# Altium footprint library Intelliclone.PcbLib: 372 footprints (part 10 of 24)
Each footprint in its own frame and in the unit in brackets; x right, y up, seen from the top. Pads: shape width x height; smd on the part's side, far side on the other; paste and mask are expansions set on the pad; w line width, h text height; cw(c..) or ccw(c..) is an arc to the next point about the centre after c.
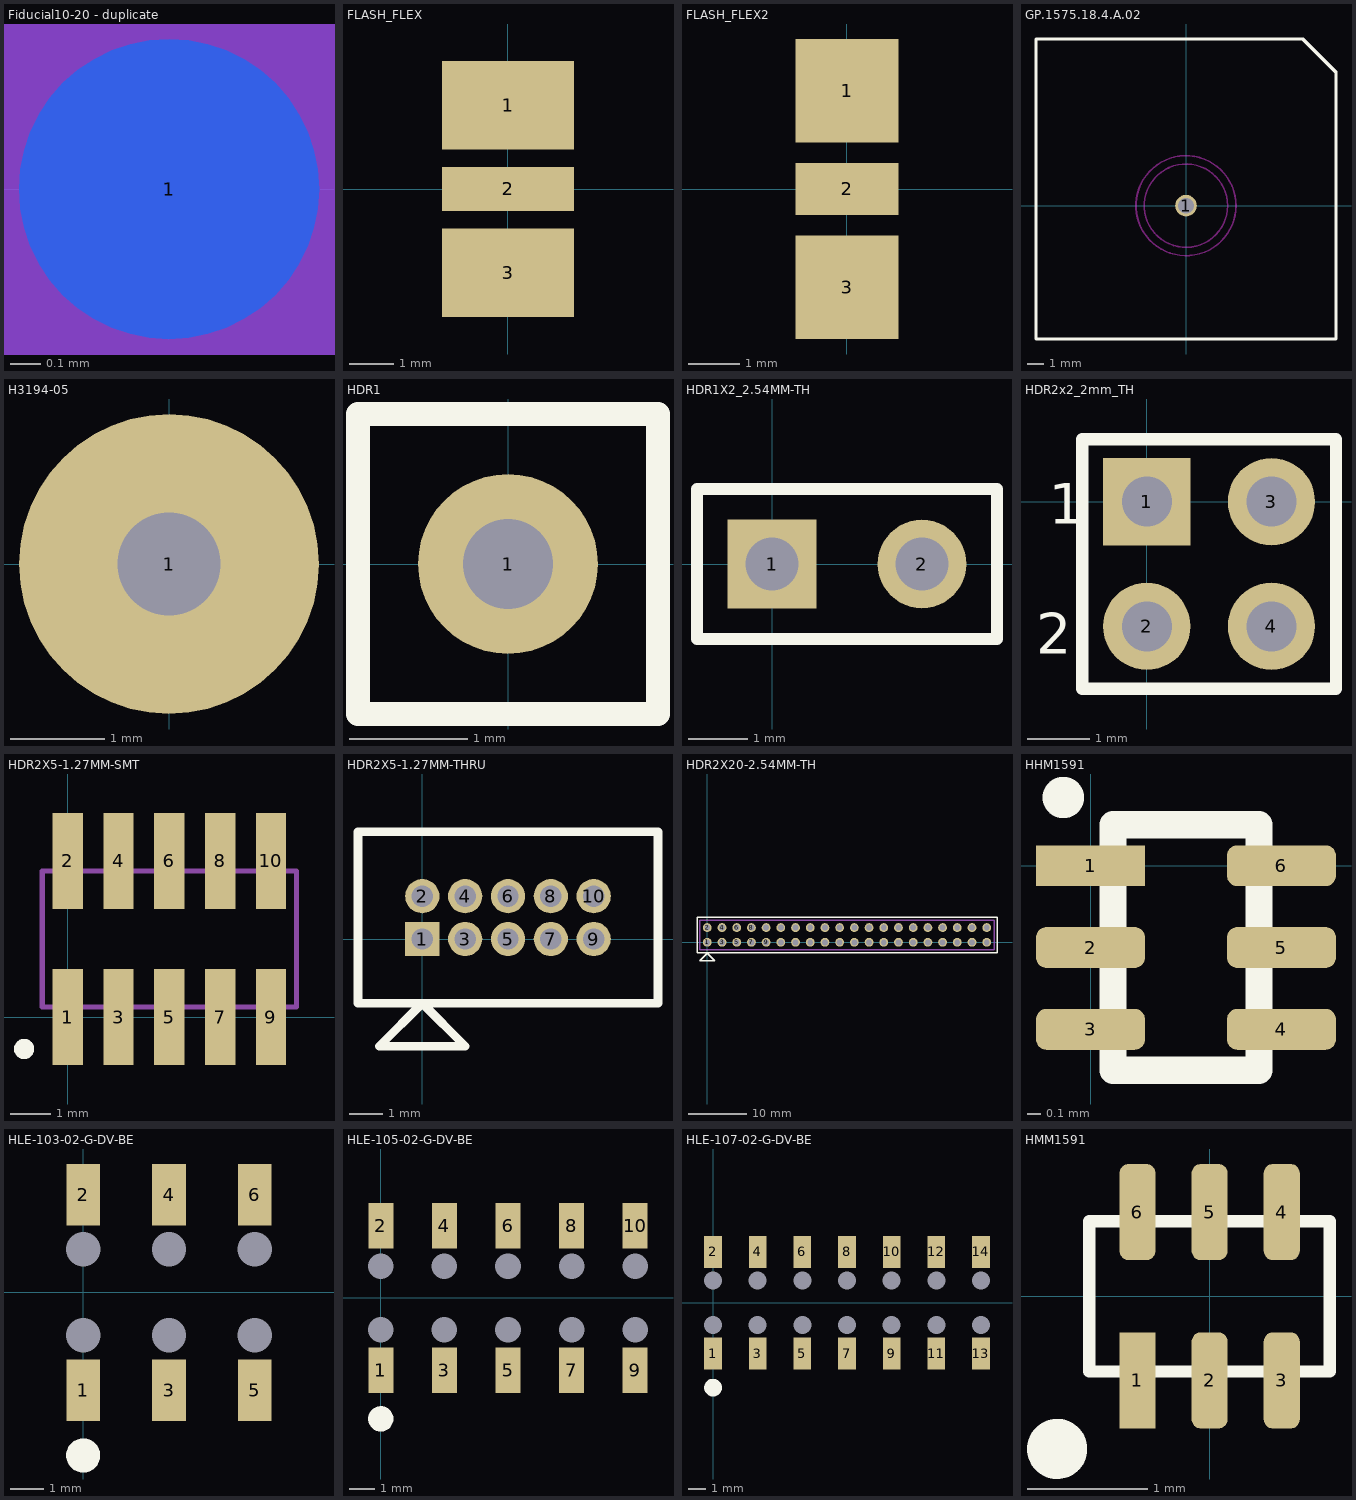
[diagram p9: the footprints below, top view; thin cyan lines are the x and y axes]

## Fiducial10-20 - duplicate [mm]
height 0.4
pads (1):
  round 1 smd far side mask+0.5: 1(0,0)
Bottom Layer keep-out:
  circle w1.178: c0,0 r0.5

## FLASH_FLEX [mm] "Hot Bar Connect for Flash LED"
pads (3):
  rect 3x2 smd paste-5: 1(0,1.9) 3(0,-1.9)
  rect 3x1 smd paste-5: 2(0,0)

## FLASH_FLEX2 [mm] "Hot Bar Connect for Flash LED"
pads (3):
  rect 2x2 smd paste-5: 1(0,1.9) 3(0,-1.9)
  rect 2x1 smd paste-5: 2(0,0)

## GP.1575.18.4.A.02 [mm] "ANTENNA PATCH GPS PIN FED"
height 4
pads (1):
  round 1.3 / inner round 1.3 / far side round 2.5 hole 0.95: 1(0,0)
Top Layer keep-out:
  circle w0.1: c0,0 r3
Top Overlay:
  lines w0.2: -9,-8 9,-8 9,8 7,10 -9,10 -9,0 -9,-8
Keep-Out Layer:
  circle w0.1: c0,0 r2.5
3D body "GPS-Antenna2.STEP": height 4.6, standoff 0, extent -9,-8 9,10

## H3194-05 [mm] "PC BOARD SOCKET WITH PC TAIL"
pads (1):
  round 3.2 / inner round 1.7 / far side round 1.7 hole 1.1: 1(0,0)

## HDR1 [mil] "Header .100\" spaced, single pin"
height 165
pads (1):
  round 60 hole 30: 1(0,0)
Top Overlay:
  lines w7.87: -50,-50 -50,50 50,50 50,-50 -50,-50
3D body: height 165, standoff 0, extent -49.6,-49.9 50,49.9

## HDR1X2_2.54MM-TH [mm] "Connector; Header; 2 Position"
pads (2):
  rect 1.5x1.5 hole 0.9: 1(0,0)
  round 1.5 hole 0.9: 2(2.54,0)
Top Overlay:
  lines w0.2: -1.27,-1.27 3.81,-1.27 3.81,1.27 -1.27,1.27 -1.27,-1.27
3D body "TSW-102-07-G-S.stp": height 8.38, standoff -2.54, extent -1.397,-1.27 3.81,1.27

## HDR2x2_2mm_TH [mm]
pads (4):
  rect 1.4x1.4 hole 0.8: 1(0,0)
  round 1.4 hole 0.8: 2(0,-2) 3(2,0) 4(2,-2)
Top Overlay:
  lines w0.2: -1.035,-3 -1.035,1 3.035,1 3.035,-3 -1.035,-3
  text "2" at -1.778,-2.438 h0.65
  text "1" at -1.575,-0.356 h0.65
3D body "TMM-102-02-T-D.stp": height 5.26, standoff -2.95, extent -1.009,-2.959 2.991,0.978

## HDR2X5-1.27MM-SMT [mm] "Dual row connector, 10-pin"
height 4.1
pads (10):
  rect 0.76x2.4 smd: 1(0,0) 2(0,3.9) 3(1.27,0) 4(1.27,3.9) 5(2.54,0) 6(2.54,3.9) 7(3.81,0) 8(3.81,3.9) 9(5.08,0) 10(5.08,3.9)
Top Overlay:
  circle w0.254: c-1.09,-0.798 r0.127
Mechanical 13:
  lines w0.127: -0.635,0.25 5.715,0.25 5.715,3.65 -0.635,3.65 -0.635,0.25
3D body "20021121-00010XXLFc.stp": height 4.45, standoff -0.05, extent -0.65,-0.842 5.7,4.658

## HDR2X5-1.27MM-THRU [mil]
pads (10):
  rect 40x40 hole 25: 1(0,0)
  round 40 hole 25: 2(0,50) 3(50,0) 4(50,50) 5(100,0) 6(100,50) 7(150,0) 8(150,50) 9(200,0) 10(200,50)
Top Overlay:
  lines w10: -75,-75 275,-75 275,125 -75,125 -75,-75 ; -50,-125 0,-75 50,-125 -50,-125
3D body "20021111-00010XXLFc.stp": height 216.54, standoff -92.52, extent -25,-42 225,91.86

## HDR2X20-2.54MM-TH [mil] "40 Positions Header, Unshrouded Connector 0.100\" (2.54mm) Through Hole Tin"
pads (40):
  round 60 hole 40 mask+3: 1(0,0) 2(0,100) 3(100,0) 4(100,100) 5(200,0) 6(200,100) 7(300,0) 8(300,100) 9(400,0) 10(400,100) 11(500,0) 12(500,100) 13(600,0) 14(600,100) 15(700,0) 16(700,100) 17(800,0) 18(800,100) 19(900,0) 20(900,100) 21(1000,0) 22(1000,100) 23(1100,0) 24(1100,100) 25(1200,0) 26(1200,100) 27(1300,0) 28(1300,100) 29(1400,0) 30(1400,100) 31(1500,0) 32(1500,100) 33(1600,0) 34(1600,100) 35(1700,0) 36(1700,100) 37(1800,0) 38(1800,100) 39(1900,0) 40(1900,100)
Top Overlay:
  lines w10: 430,-70 970,-70 ; 430,170 970,170 ; 470,-70 -70,-70 -70,170 470,170 ; 930,-70 1470,-70 ; 930,170 1470,170 ; 1430,-70 1970,-70 1970,170 1430,170 ; -50,-125 0,-75 50,-125 -50,-125
Mechanical 1:
  lines w10: -50,-50 450,-50 950,-50 1450,-50 1950,-50 1950,150 1450,150 950,150 450,150 -50,150 -50,-50
  text "J1" at 0,200 h30
3D body "929836-03-06.stp": height 335, standoff -410, extent 1350.01,-59.31 1950.01,155.7
3D body "929836-03-06.stp": height 335, standoff -410, extent 1150.01,-59.3 1750.01,155.7
3D body "929836-03-06.stp": height 335, standoff -410, extent 550,-59.3 1150,155.7
3D body "929836-03-06.stp": height 335, standoff -410, extent -50,-59.31 550,155.69

## HHM1591 [mm] "XFRMR BALUN RF 400MHZ SMD"
pads (6):
  rect 0.8x0.3 smd: 1(0,0)
  rrect50% 0.8x0.3 smd: 2(0,-0.6) 3(0,-1.2) 4(1.4,-1.2) 5(1.4,-0.6) 6(1.4,0)
Top Overlay:
  circle w0.254: c-0.2,0.5 r0.025
  lines w0.2: 0.55,0.3 1.235,0.3 1.235,-1.5 0.165,-1.5 0.165,0.3 0.85,0.3

## HLE-103-02-G-DV-BE [mm] "Samtec HLE-103-02-G-DV-BE"
pads (12):
  rect 0x0 hole 1.02 unplated: 0(0,-1.27) 0(0,1.27) 0(2.54,-1.27) 0(2.54,1.27) 0(5.08,-1.27) 0(5.08,1.27)
  rect 1x1.82 smd: 1(0,-2.89) 2(0,2.89) 3(2.54,-2.89) 4(2.54,2.89) 5(5.08,-2.89) 6(5.08,2.89)
Top Overlay:
  circle w0.5: c0,-4.826 r0.254
3D body "HLE-103-02-G-DV-BE.stp": height 3.71, standoff 0.05, extent -1.27,-3.289 6.35,3.289

## HLE-105-02-G-DV-BE [mm] "Samtec HLE-105-02-G-DV-BE"
pads (20):
  rect 0x0 hole 1.02 unplated: 0(0,-1.27) 0(0,1.27) 0(2.54,-1.27) 0(2.54,1.27) 0(5.08,-1.27) 0(5.08,1.27) 0(7.62,-1.27) 0(7.62,1.27) 0(10.16,-1.27) 0(10.16,1.27)
  rect 1x1.82 smd: 1(0,-2.89) 2(0,2.89) 3(2.54,-2.89) 4(2.54,2.89) 5(5.08,-2.89) 6(5.08,2.89) 7(7.62,-2.89) 8(7.62,2.89) 9(10.16,-2.89) 10(10.16,2.89)
Top Overlay:
  circle w0.5: c0,-4.826 r0.254
3D body "HLE-105-02-G-DV-BE.stp": height 3.71, standoff 0.05, extent -1.27,-3.289 11.43,3.289

## HLE-107-02-G-DV-BE [mm] "Samtec HLE-107-02-G-DV-BE"
pads (28):
  rect 0x0 hole 1.02 unplated: 0(0,-1.27) 0(0,1.27) 0(2.54,-1.27) 0(2.54,1.27) 0(5.08,-1.27) 0(5.08,1.27) 0(7.62,-1.27) 0(7.62,1.27) 0(10.16,-1.27) 0(10.16,1.27) 0(12.7,-1.27) 0(12.7,1.27) 0(15.24,-1.27) 0(15.24,1.27)
  rect 1x1.82 smd: 1(0,-2.89) 2(0,2.89) 3(2.54,-2.89) 4(2.54,2.89) 5(5.08,-2.89) 6(5.08,2.89) 7(7.62,-2.89) 8(7.62,2.89) 9(10.16,-2.89) 10(10.16,2.89) 11(12.7,-2.89) 12(12.7,2.89) 13(15.24,-2.89) 14(15.24,2.89)
Top Overlay:
  circle w0.5: c0,-4.826 r0.254
3D body "HLE-107-02-G-DV-BE.stp": height 3.71, standoff 0.05, extent -1.27,-3.289 16.51,3.29

## HMM1591 [mm]
pads (6):
  rect 0.3x0.8 smd: 1(-0.6,-0.7)
  rrect50% 0.3x0.8 smd: 2(0,-0.7) 3(0.6,-0.7) 4(0.6,0.7) 5(0,0.7) 6(-0.6,0.7)
Top Overlay:
  circle w0.25: c-1.268,-1.27 r0.125
  lines w0.102: -1,-0.625 1,-0.625 1,0.625 -1,0.625 -1,-0.625
3D body: height 0.8, standoff 0.05, extent -1.016,-0.635 1.016,0.635